# Altium schematic symbol library Semi-ATE.SchLib: 322 symbols (part 4 of 6)
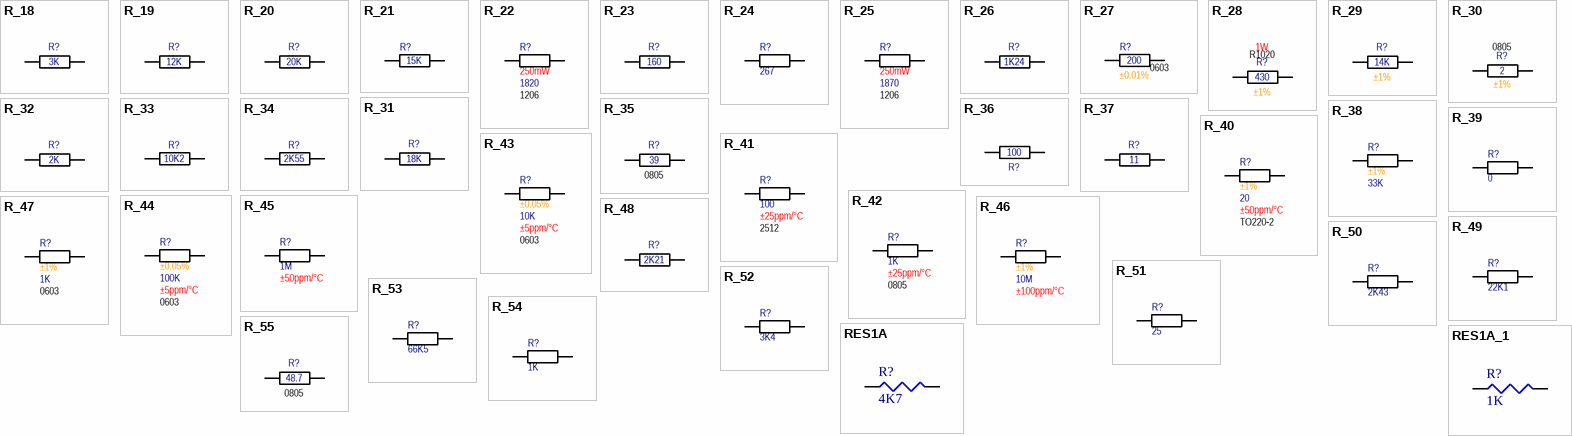
[diagram p22: symbols R_18 to RES1A_1]

## R_22
designator R?, comment value 1820  Power Rating: 250mW  Package: 1206  (hidden comment: R)
RES SMD 1.82K OHM 0.1% 1/4W 1206; 04. Manufacturer: Panasonic Electronic Components; 07. Manufacturer  Part Number: ERA-8ARB1821V; 03. Unit Price: 1.09; 13. Created Date/Name: AUG2018/Hören; TC: ±10ppm/°C; 3D-Export: No; Tolerance: ±0.1%; ComponentLink1URL: *; ComponentLink1Description: Info; 02. Distributor Part Number: P18601DKR-ND; 09. Operating Temperature: -55°C ~ 155°C; 11. RoHS: YES; 01. Distributor: DigiKey; ComponentLink2Description: DataSheet; Type: Thin Film
simulation model RESISTOR (Resistor)
signal-integrity model Res
footprint TO247-2
footprint R0201 Reflow (SMT Resistor 0201 Reflow Soldering)
footprint R0402 Reflow (SMT Resistor 0402 Reflow Soldering)
footprint R0603 Reflow (SMT Resistor 0603 Reflow Soldering)
footprint R0603 Wave (SMT Resistor 0603 Wave Soldering)
footprint R0805 Wave (SMT Resistor 0805 Wave Soldering)
footprint R0805 Reflow (SMT Resistor 0805 Reflow Soldering)
footprint R01005 Reflow (SMT Resistor 01005 Reflow Soldering)
footprint R1020 Reflow (SMT Resistor 0805 Reflow Soldering)
footprint R1020 Wave (SMT Resistor 0805 Wave Soldering)
footprint R1812 Reflow (SMT Resistor 1812 Reflow Soldering)
footprint R1812 Wave (SMT Resistor 1812 Wave Soldering)
footprint R1206 Reflow (SMT Resistor 1206 Reflow Soldering)
footprint R1206 Wave (SMT Resistor 1206 Wave Soldering)
footprint R1210 Reflow (SMT Resistor 1210 Reflow Soldering)
footprint R1210 Wave (SMT Resistor 1210 Wave Soldering)
footprint R2010 Reflow (SMT Resistor 2010 Reflow Soldering)
footprint R2010 Wave (SMT Resistor 2010 Wave Soldering)
footprint R2512 Reflow (SMT Resistor 2512 Reflow Soldering)
footprint R2512 Wave (SMT Resistor 2512 Wave Soldering)
pins: 1, 2
1 alternate drawing of the same symbol

## R_23
designator R?, comment value 160  (hidden comment: R)
RES SMD 160 OHM 0.1% 1/16W 0402; 04. Manufacturer: Panasonic Electronic Components; 07. Manufacturer  Part Number: ERA-2AEB161X; 03. Unit Price: 0.4; 13. Created Date/Name: AUG2018/Hören; Power Rating: 63mW; TC: ±25ppm/°C; 3D-Export: No; Tolerance: ±0.1%; ComponentLink1URL: *; ComponentLink1Description: Info; 02. Distributor Part Number: P160DCDKR-ND; 09. Operating Temperature: -55°C ~ 155°C; 11. RoHS: YES; 01. Distributor: DigiKey; ComponentLink2Description: DataSheet; Type: Thin Film; Package: 0402
simulation model RESISTOR (Resistor)
signal-integrity model Res
footprint TO247-2
footprint R0201 Reflow (SMT Resistor 0201 Reflow Soldering)
footprint R0402 Reflow (SMT Resistor 0402 Reflow Soldering)
footprint R0603 Reflow (SMT Resistor 0603 Reflow Soldering)
footprint R0603 Wave (SMT Resistor 0603 Wave Soldering)
footprint R0805 Wave (SMT Resistor 0805 Wave Soldering)
footprint R0805 Reflow (SMT Resistor 0805 Reflow Soldering)
footprint R01005 Reflow (SMT Resistor 01005 Reflow Soldering)
footprint R1020 Reflow (SMT Resistor 0805 Reflow Soldering)
footprint R1020 Wave (SMT Resistor 0805 Wave Soldering)
footprint R1812 Reflow (SMT Resistor 1812 Reflow Soldering)
footprint R1812 Wave (SMT Resistor 1812 Wave Soldering)
footprint R1206 Reflow (SMT Resistor 1206 Reflow Soldering)
footprint R1206 Wave (SMT Resistor 1206 Wave Soldering)
footprint R1210 Reflow (SMT Resistor 1210 Reflow Soldering)
footprint R1210 Wave (SMT Resistor 1210 Wave Soldering)
footprint R2010 Reflow (SMT Resistor 2010 Reflow Soldering)
footprint R2010 Wave (SMT Resistor 2010 Wave Soldering)
footprint R2512 Reflow (SMT Resistor 2512 Reflow Soldering)
footprint R2512 Wave (SMT Resistor 2512 Wave Soldering)
pins: 1, 2
1 alternate drawing of the same symbol

## R_24
designator R?, comment value 267  (hidden comment: R)
RES SMD 267 OHM 0.1% 1/16W 0402; 04. Manufacturer: Panasonic Electronic Components; 07. Manufacturer  Part Number: ERA-2AEB2670X; 03. Unit Price: 0.4; 13. Created Date/Name: AUG2018/Hören; Power Rating: 63mW; TC: ±25ppm/°C; 3D-Export: No; Tolerance: ±0.1%; ComponentLink1URL: *; ComponentLink1Description: Info; 02. Distributor Part Number: P267DCDKR-ND; 09. Operating Temperature: -55°C ~ 155°C; 11. RoHS: YES; 01. Distributor: DigiKey; ComponentLink2Description: DataSheet; Type: Thin Film; Package: 0402
simulation model RESISTOR (Resistor)
signal-integrity model Res
footprint TO247-2
footprint R0201 Reflow (SMT Resistor 0201 Reflow Soldering)
footprint R0402 Reflow (SMT Resistor 0402 Reflow Soldering)
footprint R0603 Reflow (SMT Resistor 0603 Reflow Soldering)
footprint R0603 Wave (SMT Resistor 0603 Wave Soldering)
footprint R0805 Wave (SMT Resistor 0805 Wave Soldering)
footprint R0805 Reflow (SMT Resistor 0805 Reflow Soldering)
footprint R01005 Reflow (SMT Resistor 01005 Reflow Soldering)
footprint R1020 Reflow (SMT Resistor 0805 Reflow Soldering)
footprint R1020 Wave (SMT Resistor 0805 Wave Soldering)
footprint R1812 Reflow (SMT Resistor 1812 Reflow Soldering)
footprint R1812 Wave (SMT Resistor 1812 Wave Soldering)
footprint R1206 Reflow (SMT Resistor 1206 Reflow Soldering)
footprint R1206 Wave (SMT Resistor 1206 Wave Soldering)
footprint R1210 Reflow (SMT Resistor 1210 Reflow Soldering)
footprint R1210 Wave (SMT Resistor 1210 Wave Soldering)
footprint R2010 Reflow (SMT Resistor 2010 Reflow Soldering)
footprint R2010 Wave (SMT Resistor 2010 Wave Soldering)
footprint R2512 Reflow (SMT Resistor 2512 Reflow Soldering)
footprint R2512 Wave (SMT Resistor 2512 Wave Soldering)
pins: 1, 2
1 alternate drawing of the same symbol

## R_25
designator R?, comment value 1870  Power Rating: 250mW  Package: 1206  (hidden comment: R)
RES SMD 1.87K OHM 0.1% 1/4W 1206; 04. Manufacturer: Panasonic Electronic Components; 07. Manufacturer  Part Number: ERA-8ARB1871V; 03. Unit Price: 1.09; 13. Created Date/Name: AUG2018/Hören; TC: ±10ppm/°C; 3D-Export: No; Tolerance: ±0.1%; ComponentLink1URL: *; ComponentLink1Description: Info; 02. Distributor Part Number: P18603DKR-ND; 09. Operating Temperature: -55°C ~ 155°C; 11. RoHS: YES; 01. Distributor: DigiKey; ComponentLink2Description: DataSheet; Type: Thin Film
simulation model RESISTOR (Resistor)
signal-integrity model Res
footprint TO247-2
footprint R0201 Reflow (SMT Resistor 0201 Reflow Soldering)
footprint R0402 Reflow (SMT Resistor 0402 Reflow Soldering)
footprint R0603 Reflow (SMT Resistor 0603 Reflow Soldering)
footprint R0603 Wave (SMT Resistor 0603 Wave Soldering)
footprint R0805 Wave (SMT Resistor 0805 Wave Soldering)
footprint R0805 Reflow (SMT Resistor 0805 Reflow Soldering)
footprint R01005 Reflow (SMT Resistor 01005 Reflow Soldering)
footprint R1020 Reflow (SMT Resistor 0805 Reflow Soldering)
footprint R1020 Wave (SMT Resistor 0805 Wave Soldering)
footprint R1812 Reflow (SMT Resistor 1812 Reflow Soldering)
footprint R1812 Wave (SMT Resistor 1812 Wave Soldering)
footprint R1206 Reflow (SMT Resistor 1206 Reflow Soldering)
footprint R1206 Wave (SMT Resistor 1206 Wave Soldering)
footprint R1210 Reflow (SMT Resistor 1210 Reflow Soldering)
footprint R1210 Wave (SMT Resistor 1210 Wave Soldering)
footprint R2010 Reflow (SMT Resistor 2010 Reflow Soldering)
footprint R2010 Wave (SMT Resistor 2010 Wave Soldering)
footprint R2512 Reflow (SMT Resistor 2512 Reflow Soldering)
footprint R2512 Wave (SMT Resistor 2512 Wave Soldering)
pins: 1, 2
1 alternate drawing of the same symbol

## R_26
designator R?, comment value 1K24  (hidden comment: R)
RES SMD 1.24KOHM 0.1% 1/16W 0402; 04. Manufacturer: Panasonic Electronic Components; 07. Manufacturer  Part Number: ERA-2AEB1241X; 03. Unit Price: 0.4; 13. Created Date/Name: AUG2018/Hören; Power Rating: 63mW; 3D-Export: No; Tolerance: ±0.1%; ComponentLink1URL: *; ComponentLink1Description: Info; 02. Distributor Part Number: P1.24KDCDKR-ND; 09. Operating Temperature: -55°C ~ 155°C; 11. RoHS: YES; 01. Distributor: DigiKey; ComponentLink2Description: DataSheet; Type: Thin Film; Package: 0402
simulation model RESISTOR (Resistor)
signal-integrity model Res
footprint TO247-2
footprint R0201 Reflow (SMT Resistor 0201 Reflow Soldering)
footprint R0402 Reflow (SMT Resistor 0402 Reflow Soldering)
footprint R0603 Reflow (SMT Resistor 0603 Reflow Soldering)
footprint R0603 Wave (SMT Resistor 0603 Wave Soldering)
footprint R0805 Wave (SMT Resistor 0805 Wave Soldering)
footprint R0805 Reflow (SMT Resistor 0805 Reflow Soldering)
footprint R01005 Reflow (SMT Resistor 01005 Reflow Soldering)
footprint R1020 Reflow (SMT Resistor 0805 Reflow Soldering)
footprint R1020 Wave (SMT Resistor 0805 Wave Soldering)
footprint R1812 Reflow (SMT Resistor 1812 Reflow Soldering)
footprint R1812 Wave (SMT Resistor 1812 Wave Soldering)
footprint R1206 Reflow (SMT Resistor 1206 Reflow Soldering)
footprint R1206 Wave (SMT Resistor 1206 Wave Soldering)
footprint R1210 Reflow (SMT Resistor 1210 Reflow Soldering)
footprint R1210 Wave (SMT Resistor 1210 Wave Soldering)
footprint R2010 Reflow (SMT Resistor 2010 Reflow Soldering)
footprint R2010 Wave (SMT Resistor 2010 Wave Soldering)
footprint R2512 Reflow (SMT Resistor 2512 Reflow Soldering)
footprint R2512 Wave (SMT Resistor 2512 Wave Soldering)
pins: 1, 2
1 alternate drawing of the same symbol

## R_27
designator R?, comment value 200  Tolerance: ±0.01%  Package: 0603  (hidden comment: R)
RES 200 OHM 0.01% 1/10W 0603; 04. Manufacturer: Stackpole Electronics Inc; 07. Manufacturer  Part Number: RNCF0603TKY200R; 03. Unit Price: 1.96; 13. Created Date/Name: AUG2018/Hören; Power Rating: 100mW; 3D-Export: No; ComponentLink1URL: https://www.digikey.de/products/en?keywords=RNCF0603TKY200RDKR-ND; ComponentLink1Description: Info; 02. Distributor Part Number: RNCF0603TKY200RDKR-ND; 09. Operating Temperature: -55°C ~ 155°C; 11. RoHS: YES; 01. Distributor: DigiKey; ComponentLink2Description: DataSheet; ComponentLink2URL: https://www.seielect.com/catalog/sei-rncf.pdf; Type: Thin Film
simulation model RESISTOR (Resistor)
signal-integrity model Res
footprint TO247-2
footprint R0201 Reflow (SMT Resistor 0201 Reflow Soldering)
footprint R0402 Reflow (SMT Resistor 0402 Reflow Soldering)
footprint R0603 Reflow (SMT Resistor 0603 Reflow Soldering)
footprint R0603 Wave (SMT Resistor 0603 Wave Soldering)
footprint R0805 Wave (SMT Resistor 0805 Wave Soldering)
footprint R0805 Reflow (SMT Resistor 0805 Reflow Soldering)
footprint R01005 Reflow (SMT Resistor 01005 Reflow Soldering)
footprint R1020 Reflow (SMT Resistor 0805 Reflow Soldering)
footprint R1020 Wave (SMT Resistor 0805 Wave Soldering)
footprint R1812 Reflow (SMT Resistor 1812 Reflow Soldering)
footprint R1812 Wave (SMT Resistor 1812 Wave Soldering)
footprint R1206 Reflow (SMT Resistor 1206 Reflow Soldering)
footprint R1206 Wave (SMT Resistor 1206 Wave Soldering)
footprint R1210 Reflow (SMT Resistor 1210 Reflow Soldering)
footprint R1210 Wave (SMT Resistor 1210 Wave Soldering)
footprint R2010 Reflow (SMT Resistor 2010 Reflow Soldering)
footprint R2010 Wave (SMT Resistor 2010 Wave Soldering)
footprint R2512 Reflow (SMT Resistor 2512 Reflow Soldering)
footprint R2512 Wave (SMT Resistor 2512 Wave Soldering)
footprint TO-220-2-Standing
pins: 1, 2
1 alternate drawing of the same symbol

## R_28
designator R?, comment value 430  Tolerance: ±1%  Power Rating: 1W  Package: R1020  (hidden comment: R)
RES SMD 430 OHM 1W 2010 WIDE; 04. Manufacturer: Rohm Semiconductor; 07. Manufacturer  Part Number: LTR50UZPF4300; 03. Unit Price: 0.55; 13. Created Date/Name: AUG2018/Hören; 3D-Export: No; ComponentLink1URL: https://www.digikey.de/products/en?keywords=RHM430ACDKR-ND; ComponentLink1Description: Info; 02. Distributor Part Number: RHM430ACDKR-ND; 09. Operating Temperature: -55°C ~ 155°C; 11. RoHS: YES; 01. Distributor: DigiKey; ComponentLink2Description: DataSheet; ComponentLink2URL: https://www.rohm.com/datasheet/LTR100JZPD/ltr-e; Type: Thick Film
simulation model RESISTOR (Resistor)
signal-integrity model Res
footprint TO247-2
footprint R0201 Reflow (SMT Resistor 0201 Reflow Soldering)
footprint R0402 Reflow (SMT Resistor 0402 Reflow Soldering)
footprint R0603 Reflow (SMT Resistor 0603 Reflow Soldering)
footprint R0603 Wave (SMT Resistor 0603 Wave Soldering)
footprint R0805 Wave (SMT Resistor 0805 Wave Soldering)
footprint R0805 Reflow (SMT Resistor 0805 Reflow Soldering)
footprint R01005 Reflow (SMT Resistor 01005 Reflow Soldering)
footprint R1020 Reflow (SMT Resistor 0805 Reflow Soldering)
footprint R1020 Wave (SMT Resistor 0805 Wave Soldering)
footprint R1812 Reflow (SMT Resistor 1812 Reflow Soldering)
footprint R1812 Wave (SMT Resistor 1812 Wave Soldering)
footprint R1206 Reflow (SMT Resistor 1206 Reflow Soldering)
footprint R1206 Wave (SMT Resistor 1206 Wave Soldering)
footprint R1210 Reflow (SMT Resistor 1210 Reflow Soldering)
footprint R1210 Wave (SMT Resistor 1210 Wave Soldering)
footprint R2010 Reflow (SMT Resistor 2010 Reflow Soldering)
footprint R2010 Wave (SMT Resistor 2010 Wave Soldering)
footprint R2512 Reflow (SMT Resistor 2512 Reflow Soldering)
footprint R2512 Wave (SMT Resistor 2512 Wave Soldering)
footprint TO-220-2-Standing
pins: 1, 2
1 alternate drawing of the same symbol

## R_29
designator R?, comment value 14K  Tolerance: ±1%  (hidden comment: R)
RES SMD 14K OHM 1% 1/16W 0402; 04. Manufacturer: Yageo; 07. Manufacturer  Part Number: RC0402FR-0714KL; 03. Unit Price: 0.09; 13. Created Date/Name: AUG2018/Hören; Power Rating: 63mW; 3D-Export: No; ComponentLink1URL: https://www.digikey.de/products/en?keywords=311-14.0KLRDKR-ND; ComponentLink1Description: Info; 02. Distributor Part Number: 311-14.0KLRDKR-ND; 09. Operating Temperature: -55°C ~ 155°C; 11. RoHS: YES; 01. Distributor: DigiKey; ComponentLink2Description: DataSheet; ComponentLink2URL: http://www.yageo.com/documents/recent/PYu-RC_Group_51_RoHS_L_10.pdf; Type: Thick Film; Package: 0402
simulation model RESISTOR (Resistor)
signal-integrity model Res
footprint TO247-2
footprint R0201 Reflow (SMT Resistor 0201 Reflow Soldering)
footprint R0402 Reflow (SMT Resistor 0402 Reflow Soldering)
footprint R0603 Reflow (SMT Resistor 0603 Reflow Soldering)
footprint R0603 Wave (SMT Resistor 0603 Wave Soldering)
footprint R0805 Wave (SMT Resistor 0805 Wave Soldering)
footprint R0805 Reflow (SMT Resistor 0805 Reflow Soldering)
footprint R01005 Reflow (SMT Resistor 01005 Reflow Soldering)
footprint R1020 Reflow (SMT Resistor 0805 Reflow Soldering)
footprint R1020 Wave (SMT Resistor 0805 Wave Soldering)
footprint R1812 Reflow (SMT Resistor 1812 Reflow Soldering)
footprint R1812 Wave (SMT Resistor 1812 Wave Soldering)
footprint R1206 Reflow (SMT Resistor 1206 Reflow Soldering)
footprint R1206 Wave (SMT Resistor 1206 Wave Soldering)
footprint R1210 Reflow (SMT Resistor 1210 Reflow Soldering)
footprint R1210 Wave (SMT Resistor 1210 Wave Soldering)
footprint R2010 Reflow (SMT Resistor 2010 Reflow Soldering)
footprint R2010 Wave (SMT Resistor 2010 Wave Soldering)
footprint R2512 Reflow (SMT Resistor 2512 Reflow Soldering)
footprint R2512 Wave (SMT Resistor 2512 Wave Soldering)
footprint TO-220-2-Standing
pins: 1, 2
1 alternate drawing of the same symbol

## R_30
designator R?, comment value 2  Tolerance: ±1%  Package: 0805  (hidden comment: R)
RES 2 OHM 1% 1/8W 0805; 04. Manufacturer: Stackpole Electronics Inc.; 07. Manufacturer  Part Number: RMCF0805FT2R00; 03. Unit Price: 0.09; 13. Created Date/Name: AUG2018/Hören; Power Rating: 125mW; Design: AWGDIG; 3D-Export: No; ComponentLink1URL: *; ComponentLink1Description: Info; 02. Distributor Part Number: RMCF0805FT2R00DKR-ND; 09. Operating Temperature: -55°C ~ 125°C; 11. RoHS: YES; 01. Distributor: DigiKey; ComponentLink2Description: DataSheet; Type: Thick Film
simulation model RESISTOR (Resistor)
signal-integrity model Res
footprint R0201
footprint R0402 (SMT Resistor 0402)
footprint R0603 (SMT Resistor 0603)
footprint R0805 (SMT Resistor 0805)
footprint R1206 (SMT Resistor 1206)
footprint R2512
footprint TO247-2
footprint R0805 Reflow
pins: 1, 2
1 alternate drawing of the same symbol

## R_31
designator R?, comment value 18K  (hidden comment: R)
RES SMD 18K OHM 0.1% 1/16W 0402; 04. Manufacturer: Yageo; 07. Manufacturer  Part Number: RT0402BRE0718KL; 03. Unit Price: 0.37; 13. Created Date/Name: AUG2018/Hören; Power Rating: 63mW; Design: AWGDIG; 3D-Export: No; Tolerance: ±0.1%; ComponentLink1URL: https://www.digikey.de/product-detail/en/yageo/RT0402BRE0718KL/YAG4345DKR-ND/6617497; ComponentLink1Description: Info; 02. Distributor Part Number: YAG4345DKR-ND; 09. Operating Temperature: -55°C ~ 155°C; 11. RoHS: YES; 01. Distributor: DigiKey; ComponentLink2Description: DataSheet; ComponentLink2URL: http://www.yageo.com/documents/recent/PYu-RT_1-to-0.01_RoHS_L_9.pdf; Type: Thin Film; Package: 0402
simulation model RESISTOR (Resistor)
signal-integrity model Res
footprint R0201
footprint R0402 (SMT Resistor 0402)
footprint R0603 (SMT Resistor 0603)
footprint R0805 (SMT Resistor 0805)
footprint R1206 (SMT Resistor 1206)
footprint R2512
footprint TO247-2
footprint R0402 Reflow
pins: 1, 2
1 alternate drawing of the same symbol

## R_32
designator R?, comment value 2K  (hidden comment: R)
RES SMD 2K OHM 0.1% 1/16W 0402; 04. Manufacturer: Yageo; 07. Manufacturer  Part Number: RT0402BRD072KL; 03. Unit Price: 0.37; 13. Created Date/Name: AUG2018/Hören; Power Rating: 63mW; Design: AWGDIG; 3D-Export: No; Tolerance: ±0.1%; ComponentLink1URL: https://www.digikey.de/product-detail/en/yageo/RT0402BRD072KL/YAG2303DKR-ND/5252484; ComponentLink1Description: Info; 02. Distributor Part Number: YAG2303DKR-ND; 09. Operating Temperature: -55°C ~ 155°C; 11. RoHS: YES; 01. Distributor: DigiKey; ComponentLink2Description: DataSheet; ComponentLink2URL: http://www.yageo.com/documents/recent/PYu-RT_1-to-0.01_RoHS_L_9.pdf; Type: Thin Film; Package: 0402
simulation model RESISTOR (Resistor)
signal-integrity model Res
footprint R0201
footprint R0402 (SMT Resistor 0402)
footprint R0603 (SMT Resistor 0603)
footprint R0805 (SMT Resistor 0805)
footprint R1206 (SMT Resistor 1206)
footprint R2512
footprint TO247-2
footprint R0402 Reflow
pins: 1, 2
1 alternate drawing of the same symbol

## R_33
designator R?, comment value 10K2  (hidden comment: R)
RES SMD 10.2KOHM 0.1% 1/16W 0402; 04. Manufacturer: Panasonic Electronic Components; 07. Manufacturer  Part Number: ERA-2AEB1022X; 03. Unit Price: 0.39; 13. Created Date/Name: AUG2018/Hören; Power Rating: 63mW; Design: AWGDIG; 3D-Export: No; Tolerance: ±0.1%; ComponentLink1URL: https://www.digikey.de/product-detail/en/panasonic-electronic-components/ERA-2AEB1022X/P10.2KDCDKR-ND/3063945; ComponentLink1Description: Info; 02. Distributor Part Number: P10.2KDCDKR-ND; 09. Operating Temperature: -55°C ~ 155°C; 11. RoHS: YES; 01. Distributor: DigiKey; ComponentLink2Description: DataSheet; ComponentLink2URL: https://industrial.panasonic.com/cdbs/www-data/pdf/RDM0000/AOA0000C307.pdf; Type: Thin Film
simulation model RESISTOR (Resistor)
signal-integrity model Res
footprint R0201
footprint R0402 (SMT Resistor 0402)
footprint R0603 (SMT Resistor 0603)
footprint R0805 (SMT Resistor 0805)
footprint R1206 (SMT Resistor 1206)
footprint R2512
footprint TO247-2
footprint R0402 Reflow
pins: 1, 2
1 alternate drawing of the same symbol

## R_34
designator R?, comment value 2K55  (hidden comment: R)
RES SMD 2.55KOHM 0.1% 1/16W 0402; 04. Manufacturer: Panasonic Electronic Components; 07. Manufacturer  Part Number: ERA-2AEB2551X; 03. Unit Price: 0.39; 13. Created Date/Name: AUG2018/Hören; Power Rating: 63mW; Design: AWGDIG; 3D-Export: No; Tolerance: ±0.1%; ComponentLink1URL: https://www.digikey.de/product-detail/en/panasonic-electronic-components/ERA-2AEB2551X/P2.55KDCDKR-ND/3064046; ComponentLink1Description: Info; 02. Distributor Part Number: P2.55KDCDKR-ND; 09. Operating Temperature: -55°C ~ 155°C; 11. RoHS: YES; 01. Distributor: DigiKey; ComponentLink2Description: DataSheet; ComponentLink2URL: https://industrial.panasonic.com/cdbs/www-data/pdf/RDM0000/AOA0000C307.pdf; Package: 0402
simulation model RESISTOR (Resistor)
signal-integrity model Res
footprint R0201
footprint R0402 (SMT Resistor 0402)
footprint R0603 (SMT Resistor 0603)
footprint R0805 (SMT Resistor 0805)
footprint R1206 (SMT Resistor 1206)
footprint R2512
footprint TO247-2
footprint R0402 Reflow
pins: 1, 2
1 alternate drawing of the same symbol

## R_35
designator R?, comment value 39  Package: 0805  (hidden comment: R)
RES SMD 39 OHM 0.1% 1/10W 0805; 04. Manufacturer: TE Connectivity Passive Product; 07. Manufacturer  Part Number: CPF0805B39RE1; 03. Unit Price: 0.6; 13. Created Date/Name: AUG2018/Hören; Power Rating: 100mW; Design: AWGDIG; 3D-Export: No; Tolerance: ±0.1%; ComponentLink1URL: https://www.digikey.de/products/en/resistors/chip-resistor-surface-mount/52?k=&pkeyword=&sv=0&pv7=243&sf=0&FV=c0172%2C1f140000%2Cmu39+Ohms%7C2085%2Cffe00034%2C400006&quantity=&ColumnSort=0&page=1&pageSize=25; ComponentLink1Description: Info; 02. Distributor Part Number: A103203DKR-ND; 09. Operating Temperature: -55°C ~ 155°C; 11. RoHS: YES; 01. Distributor: DigiKey; ComponentLink2Description: DataSheet; ComponentLink2URL: https://www.te.com/commerce/DocumentDelivery/DDEController?Action=srchrtrv&DocNm=1773200&DocType=DS&DocLang=English; Type: Thin Film
simulation model RESISTOR (Resistor)
signal-integrity model Res
footprint R0201
footprint R0402 (SMT Resistor 0402)
footprint R0603 (SMT Resistor 0603)
footprint R0805 (SMT Resistor 0805)
footprint R1206 (SMT Resistor 1206)
footprint R2512
footprint TO247-2
footprint R0805 Reflow
pins: 1, 2
1 alternate drawing of the same symbol

## R_36
designator R?, comment value 100  (hidden comment: R)
RES SMD 0402 100R 0.1% 63MW; 04. Manufacturer: Bourns Inc.; 07. Manufacturer  Part Number: CRT0402-BY-1000GST; 03. Unit Price: 0.33; 13. Created Date/Name: AUG2018/Hören; Design: AWGDIG; 3D-Export: No; Tolerance: ±0.1%; ComponentLink1URL: https://www.digikey.de/product-detail/en/bourns-inc/CRT0402-BY-1000GST/CRT0402-BY-1000GSTDKR-ND/7928096; ComponentLink1Description: Info; 02. Distributor Part Number: CRT0402-BY-1000GSTDKR-ND; 09. Operating Temperature: -55°C ~ 155°C; 11. RoHS: YES; 01. Distributor: DigiKey; ComponentLink2Description: DataSheet; ComponentLink2URL: https://www.bourns.com/docs/Product-Datasheets/CRT-ST.pdf; Power Rating: 63mW; Package: 0402
simulation model RESISTOR (Resistor)
signal-integrity model Res
footprint R0201
footprint R0402 (SMT Resistor 0402)
footprint R0603 (SMT Resistor 0603)
footprint R0805 (SMT Resistor 0805)
footprint R1206 (SMT Resistor 1206)
footprint R2512
footprint TO247-2
footprint R2010
footprint R0402 Reflow
pins: 1, 2
1 alternate drawing of the same symbol

## R_37
designator R?, comment value 11  (hidden comment: R)
RES SMD 11 OHM 0.1% 1/16W 0402; 04. Manufacturer: TE Connectivity Passive Product; 07. Manufacturer  Part Number: CPF0402B11RE1; 03. Unit Price: 0.44; 13. Created Date/Name: AUG2018/Hören; Power Rating: 63mW; Design: AWGDIG; 3D-Export: No; Tolerance: ±0.1%; ComponentLink1URL: https://www.digikey.de/product-detail/en/te-connectivity-passive-product/CPF0402B11RE1/A102595DKR-ND/2729592; ComponentLink1Description: Info; 02. Distributor Part Number: A102595DKR-ND; 09. Operating Temperature: -55°C ~ 155°C; 11. RoHS: YES; 01. Distributor: DigiKey; ComponentLink2Description: DataSheet; ComponentLink2URL: https://www.te.com/commerce/DocumentDelivery/DDEController?Action=srchrtrv&DocNm=1773200&DocType=DS&DocLang=English; Package: 0402
simulation model RESISTOR (Resistor)
signal-integrity model Res
footprint R0201
footprint R0402 (SMT Resistor 0402)
footprint R0603 (SMT Resistor 0603)
footprint R0805 (SMT Resistor 0805)
footprint R1206 (SMT Resistor 1206)
footprint R2512
footprint TO247-2
footprint R2010
footprint R0402 Reflow
pins: 1, 2
1 alternate drawing of the same symbol

## R_38
designator R?, comment value 33K  Tolerance: ±1%  (hidden comment: R)
RES SMD 33K OHM 1% 1/16W 0402; 04. Manufacturer: Yageo; 07. Manufacturer  Part Number: RC0402FR-0733KL; 03. Unit Price: 0.09; 13. Created Date/Name: AUG2018/Hören; Power Rating: 63mW; 3D-Export: No; ComponentLink1URL: https://www.digikey.de/product-detail/en/yageo/RC0402FR-0733KL/311-33.0KLRDKR-ND/732486; ComponentLink1Description: Info; 02. Distributor Part Number: 311-33.0KLRDKR-ND; 09. Operating Temperature: -55°C ~ 155°C; 11. RoHS: YES; 01. Distributor: DigiKey; ComponentLink2Description: DataSheet; ComponentLink2URL: http://www.yageo.com/documents/recent/PYu-RC_Group_51_RoHS_L_10.pdf; Type: Thick Film
simulation model RESISTOR (Resistor)
signal-integrity model Res
footprint TO247-2
footprint R0201 Reflow (SMT Resistor 0201 Reflow Soldering)
footprint R0402 Reflow (SMT Resistor 0402 Reflow Soldering)
footprint R0603 Reflow (SMT Resistor 0603 Reflow Soldering)
footprint R0603 Wave (SMT Resistor 0603 Wave Soldering)
footprint R0805 Wave (SMT Resistor 0805 Wave Soldering)
footprint R0805 Reflow (SMT Resistor 0805 Reflow Soldering)
footprint R01005 Reflow (SMT Resistor 01005 Reflow Soldering)
footprint R1020 Reflow (SMT Resistor 0805 Reflow Soldering)
footprint R1020 Wave (SMT Resistor 0805 Wave Soldering)
footprint R1812 Reflow (SMT Resistor 1812 Reflow Soldering)
footprint R1812 Wave (SMT Resistor 1812 Wave Soldering)
footprint R1206 Reflow (SMT Resistor 1206 Reflow Soldering)
footprint R1206 Wave (SMT Resistor 1206 Wave Soldering)
footprint R1210 Reflow (SMT Resistor 1210 Reflow Soldering)
footprint R1210 Wave (SMT Resistor 1210 Wave Soldering)
footprint R2010 Reflow (SMT Resistor 2010 Reflow Soldering)
footprint R2010 Wave (SMT Resistor 2010 Wave Soldering)
footprint R2512 Reflow (SMT Resistor 2512 Reflow Soldering)
footprint R2512 Wave (SMT Resistor 2512 Wave Soldering)
footprint TO-220-2-Standing
pins: 1, 2
1 alternate drawing of the same symbol

## R_39
designator R?, comment value 0  (hidden comment: R)
RES SMD 0 OHM JUMPER 1/16W 0402; 04. Manufacturer: Yageo; 07. Manufacturer  Part Number: RC0402JR-070RL; 03. Unit Price: 0.09; 13. Created Date/Name: AUG2018/Hören; Power Rating: 63mW; 3D-Export: No; ComponentLink1URL: https://www.digikey.de/product-detail/en/yageo/RC0402JR-070RL/311-0.0JRDKR-ND/732300; ComponentLink1Description: Info; 02. Distributor Part Number: 311-0.0JRDKR-ND; 09. Operating Temperature: -55°C ~ 155°C; 11. RoHS: YES; 01. Distributor: DigiKey; ComponentLink2Description: DataSheet; ComponentLink2URL: http://www.yageo.com/documents/recent/PYu-RC_Group_51_RoHS_L_10.pdf; Type: Thick Film
simulation model RESISTOR (Resistor)
signal-integrity model Res
footprint TO247-2
footprint R0201 Reflow (SMT Resistor 0201 Reflow Soldering)
footprint R0402 Reflow (SMT Resistor 0402 Reflow Soldering)
footprint R0603 Reflow (SMT Resistor 0603 Reflow Soldering)
footprint R0603 Wave (SMT Resistor 0603 Wave Soldering)
footprint R0805 Wave (SMT Resistor 0805 Wave Soldering)
footprint R0805 Reflow (SMT Resistor 0805 Reflow Soldering)
footprint R01005 Reflow (SMT Resistor 01005 Reflow Soldering)
footprint R1020 Reflow (SMT Resistor 0805 Reflow Soldering)
footprint R1020 Wave (SMT Resistor 0805 Wave Soldering)
footprint R1812 Reflow (SMT Resistor 1812 Reflow Soldering)
footprint R1812 Wave (SMT Resistor 1812 Wave Soldering)
footprint R1206 Reflow (SMT Resistor 1206 Reflow Soldering)
footprint R1206 Wave (SMT Resistor 1206 Wave Soldering)
footprint R1210 Reflow (SMT Resistor 1210 Reflow Soldering)
footprint R1210 Wave (SMT Resistor 1210 Wave Soldering)
footprint R2010 Reflow (SMT Resistor 2010 Reflow Soldering)
footprint R2010 Wave (SMT Resistor 2010 Wave Soldering)
footprint R2512 Reflow (SMT Resistor 2512 Reflow Soldering)
footprint R2512 Wave (SMT Resistor 2512 Wave Soldering)
footprint TO-220-2-Standing
pins: 1, 2
1 alternate drawing of the same symbol

## R_40
designator R?, comment value 20  Tolerance: ±1%  TC: ±50ppm/°C  Package: TO220-2  (hidden comment: R)
RES 20 OHM 35W 1% TO220; 04. Manufacturer: Riedon; 07. Manufacturer  Part Number: PF2203-20RF1; 03. Unit Price: 2.74; 13. Created Date/Name: AUG2018/Hören; 3D-Export: No; ComponentLink1URL: https://www.digikey.de/product-detail/en/riedon/PF2203-20RF1/696-1172-ND/2447816; ComponentLink1Description: Info; 02. Distributor Part Number: 696-1172-ND; 09. Operating Temperature: -55°C ~ 155°C; 11. RoHS: YES; 01. Distributor: DigiKey; ComponentLink2Description: DataSheet; ComponentLink2URL: https://riedon.com/media/pdf/PF2200.pdf; Type: Thin Film; Power Rating: 35W
simulation model RESISTOR (Resistor)
signal-integrity model Res
footprint TO247-2
footprint R0201 Reflow (SMT Resistor 0201 Reflow Soldering)
footprint R0402 Reflow (SMT Resistor 0402 Reflow Soldering)
footprint R0603 Reflow (SMT Resistor 0603 Reflow Soldering)
footprint R0603 Wave (SMT Resistor 0603 Wave Soldering)
footprint R0805 Wave (SMT Resistor 0805 Wave Soldering)
footprint R0805 Reflow (SMT Resistor 0805 Reflow Soldering)
footprint R01005 Reflow (SMT Resistor 01005 Reflow Soldering)
footprint R1020 Reflow (SMT Resistor 0805 Reflow Soldering)
footprint R1020 Wave (SMT Resistor 0805 Wave Soldering)
footprint R1812 Reflow (SMT Resistor 1812 Reflow Soldering)
footprint R1812 Wave (SMT Resistor 1812 Wave Soldering)
footprint R1206 Reflow (SMT Resistor 1206 Reflow Soldering)
footprint R1206 Wave (SMT Resistor 1206 Wave Soldering)
footprint R1210 Reflow (SMT Resistor 1210 Reflow Soldering)
footprint R1210 Wave (SMT Resistor 1210 Wave Soldering)
footprint R2010 Reflow (SMT Resistor 2010 Reflow Soldering)
footprint R2010 Wave (SMT Resistor 2010 Wave Soldering)
footprint R2512 Reflow (SMT Resistor 2512 Reflow Soldering)
footprint R2512 Wave (SMT Resistor 2512 Wave Soldering)
footprint TO-220-2-Standing
pins: 1, 2
1 alternate drawing of the same symbol

## R_41
designator R?, comment value 100  TC: ±25ppm/°C  Package: 2512  (hidden comment: R)
RES SMD 100 OHM 0.1% 6W 2512; 04. Manufacturer: Vishay Thin Film; 07. Manufacturer  Part Number: PCAN2512E1000BST5; 03. Unit Price: 5.88; 13. Created Date/Name: AUG2018/Hören; 3D-Export: No; Tolerance: ±0.1%; ComponentLink1URL: https://www.digikey.de/products/en?keywords=764-1143-1-ND; ComponentLink1Description: Info; 02. Distributor Part Number: 764-1143-1-ND; 09. Operating Temperature: -55°C ~ 155°C; 11. RoHS: YES; 01. Distributor: DigiKey; ComponentLink2Description: DataSheet; ComponentLink2URL: http://www.vishay.com/docs/60125/pcan.pdf; Type: Thin Film; Power Rating: 6W
simulation model RESISTOR (Resistor)
signal-integrity model Res
footprint TO247-2
footprint R0201 Reflow (SMT Resistor 0201 Reflow Soldering)
footprint R0402 Reflow (SMT Resistor 0402 Reflow Soldering)
footprint R0603 Reflow (SMT Resistor 0603 Reflow Soldering)
footprint R0603 Wave (SMT Resistor 0603 Wave Soldering)
footprint R0805 Wave (SMT Resistor 0805 Wave Soldering)
footprint R0805 Reflow (SMT Resistor 0805 Reflow Soldering)
footprint R01005 Reflow (SMT Resistor 01005 Reflow Soldering)
footprint R1020 Reflow (SMT Resistor 0805 Reflow Soldering)
footprint R1020 Wave (SMT Resistor 0805 Wave Soldering)
footprint R1812 Reflow (SMT Resistor 1812 Reflow Soldering)
footprint R1812 Wave (SMT Resistor 1812 Wave Soldering)
footprint R1206 Reflow (SMT Resistor 1206 Reflow Soldering)
footprint R1206 Wave (SMT Resistor 1206 Wave Soldering)
footprint R1210 Reflow (SMT Resistor 1210 Reflow Soldering)
footprint R1210 Wave (SMT Resistor 1210 Wave Soldering)
footprint R2010 Reflow (SMT Resistor 2010 Reflow Soldering)
footprint R2010 Wave (SMT Resistor 2010 Wave Soldering)
footprint R2512 Reflow (SMT Resistor 2512 Reflow Soldering)
footprint R2512 Wave (SMT Resistor 2512 Wave Soldering)
footprint TO-220-2-Standing
pins: 1, 2
1 alternate drawing of the same symbol

## R_42
designator R?, comment value 1K  TC: ±25ppm/°C  Package: 0805  (hidden comment: R)